# Altium footprint library MyPcbLib.PcbLib: 657 footprints (part 39 of 42)
Each footprint in its own frame and in the unit in brackets; x right, y up, seen from the top. Pads: shape width x height; smd on the part's side, far side on the other; paste and mask are expansions set on the pad; w line width, h text height; cw(c..) or ccw(c..) is an arc to the next point about the centre after c.
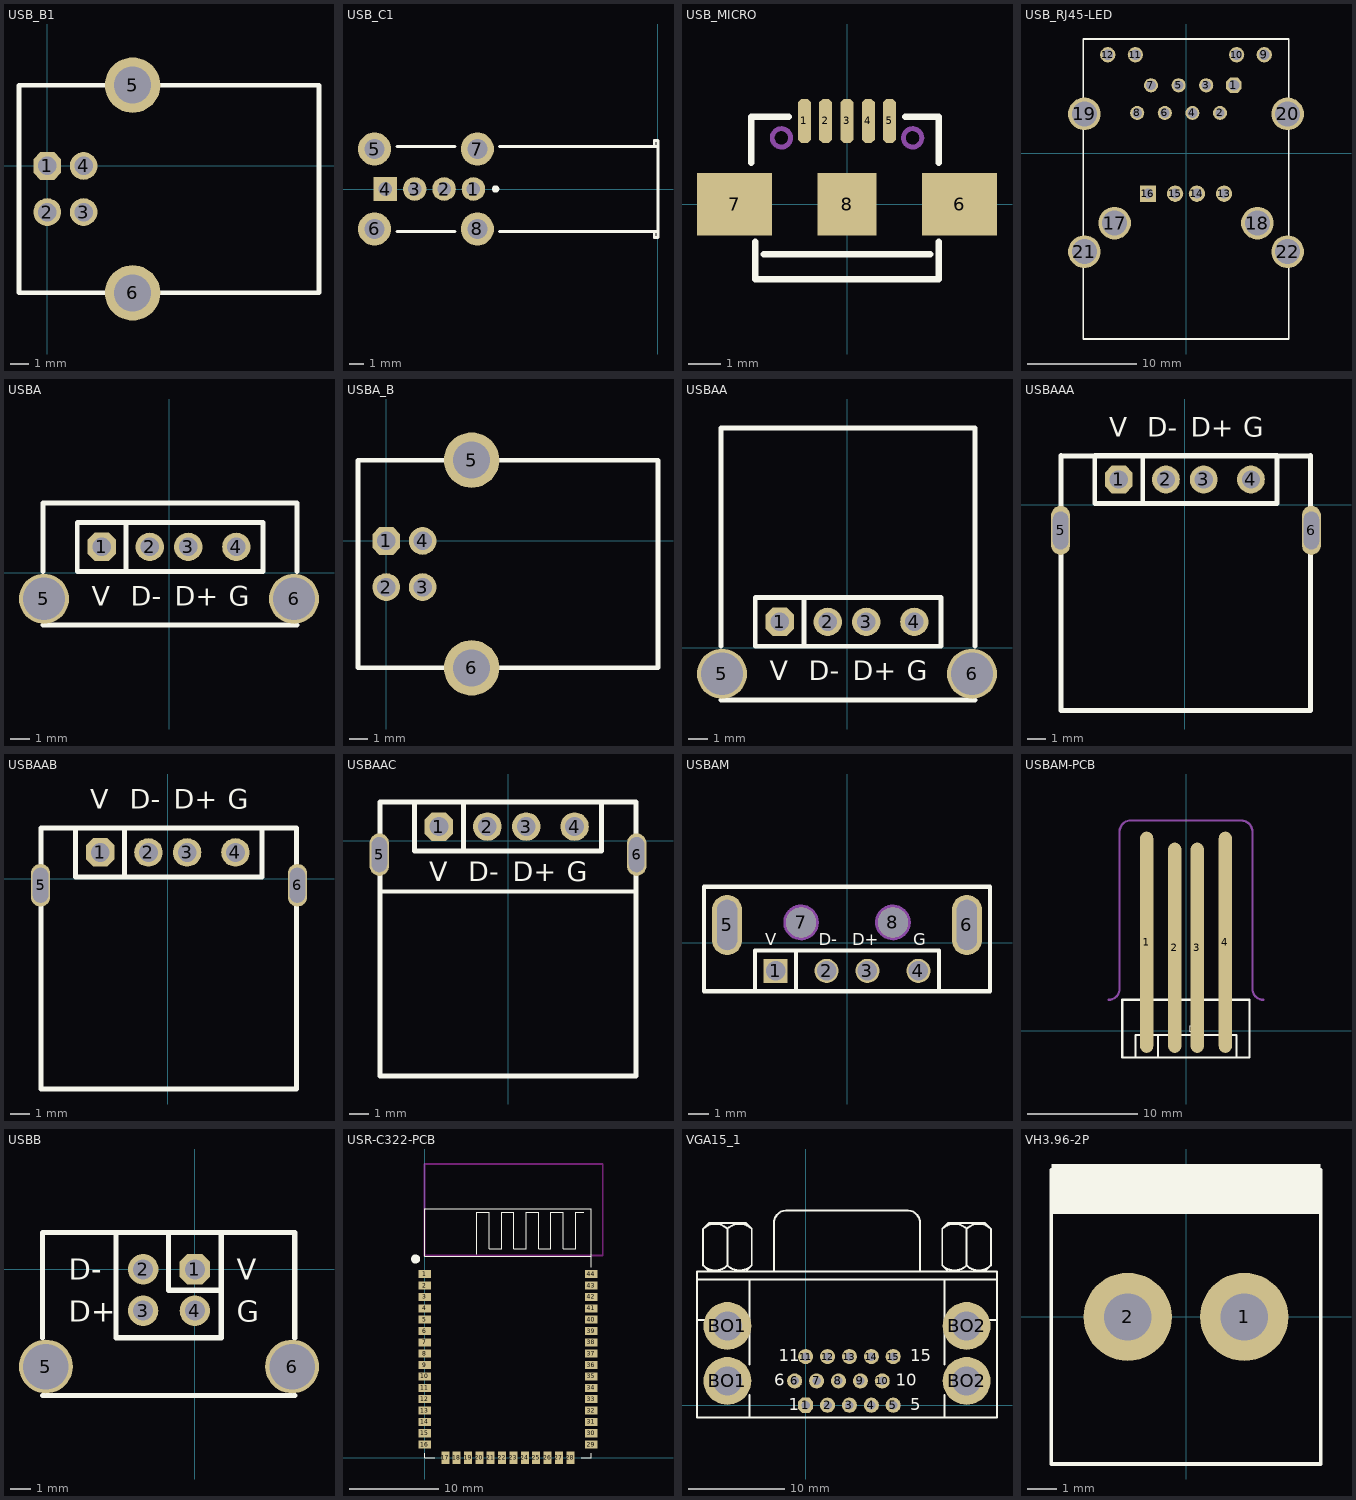
[diagram p38: the footprints below, top view; thin cyan lines are the x and y axes]

## USB_B1 [mil] "USB方孔"
height 314.96
pads (6):
  oct 60x60 hole 40: 1(0,0)
  round 60 hole 40: 2(0,-100) 3(78.74,-100) 4(78.74,0)
  round 120 hole 80: 5(185.04,175) 6(185.04,-275)
Top Overlay:
  lines w10: -61.26,-275 588.74,-275 588.74,175 -61.26,175 -61.26,-275

## USB_C1 [mm] "侧卧USB"
height 13.83
pads (8):
  round 1.6 hole 0.92: 1(-12.56,0) 2(-14.56,0) 3(-16.56,0)
  rect 1.6x1.6 hole 0.92: 4(-18.56,0)
  round 2.25 hole 1.35: 5(-19.29,2.72) 6(-19.29,-2.72) 7(-12.29,2.72) 8(-12.29,-2.72)
Top Overlay:
  circle w0.25: c-11.047,0 r0.125
  lines w0.2: -17.773,-2.88 -13.807,-2.88 ; -17.773,2.88 -13.807,2.88 ; -10.773,-2.88 0,-2.88 ; -10.773,2.88 0,2.88 ; -0.254,-2.88 -0.254,-3.302 0,-3.302 0,-2.88 ; -0.254,2.88 -0.254,3.302 0,3.302 0,2.88 ; 0,-2.88 0,2.88

## USB_MICRO [mm] "USB方孔"
height 8
pads (8):
  oct 0.4x1.35 smd: 1(-1.3,2.54) 2(-0.65,2.54) 3(0,2.54) 4(0.65,2.54) 5(1.3,2.54)
  rect 2.286x1.9 smd: 6(3.429,0) 7(-3.429,0)
  rect 1.8x1.9 smd: 8(0,0)
Top Overlay:
  lines w0.2: -2.921,1.27 -2.921,2.667 -1.778,2.667 ; -2.794,-1.143 -2.794,-2.286 2.794,-2.286 2.794,-1.143 ; -2.54,-1.524 2.54,-1.524 ; 1.778,2.667 2.794,2.667 2.794,1.27
Mechanical 1:
  circle w0.15: c-2,2.023 r0.28
  circle w0.15: c2,2.023 r0.28

## USB_RJ45-LED [mm]
pads (22):
  oct 1.4x1.4 hole 1: 1(4.4,6.25)
  round 1.3 hole 0.8: 2(3.13,3.71)
  round 1.3 hole 0.9: 3(1.86,6.25) 4(0.59,3.71) 5(-0.68,6.25) 6(-1.95,3.71) 7(-3.22,6.25) 8(-4.49,3.71)
  round 1.4 hole 1: 9(7.2,9.06) 10(4.66,9.06) 11(-4.66,9.06) 12(-7.2,9.06)
  round 1.5 hole 0.92: 13(3.5,-3.72) 14(1,-3.72) 15(-1,-3.72)
  rect 1.5x1.5 hole 0.92: 16(-3.5,-3.72)
  round 3 hole 2.3: 17(-6.57,-6.43) 18(6.57,-6.43) 19(-9.35,3.62) 20(9.35,3.62) 21(-9.35,-9.06) 22(9.35,-9.06)
Top Overlay:
  lines w0.152: -9.45,-17.09 -9.45,10.51 9.45,10.51 9.45,-17.09 -9.45,-17.09

## USBA [mm]
pads (6):
  oct 1.473x1.473 hole 0.965: 1(-3.5,1.35)
  round 1.473 hole 0.965: 2(-1,1.35) 3(1,1.35) 4(3.5,1.35)
  round 2.6 hole 2.2: 5(-6.5,-1.35) 6(6.5,-1.35)
Top Overlay:
  lines w0.254: -6.548,-2.714 6.66,-2.714 ; -6.548,0.08 -6.548,3.636 6.66,3.636 6.66,0.08 ; -2.23,0.08 -2.23,2.62 ; -4.77,0.08 -4.77,2.62 4.882,2.62 4.882,0.08 -4.77,0.08
  text "G" at 3.104,-1.698 h1.02
  text "V" at -4.008,-1.698 h1.02
  text "D+" at 0.31,-1.698 h1.02
  text "D-" at -1.976,-1.698 h1.02

## USBA_B [mil]
pads (6):
  oct 60x60 hole 40: 1(-0.24,-0.02)
  round 60 hole 40: 2(-0.24,-100.02) 3(78.5,-100.02) 4(78.5,-0.02)
  round 120 hole 80: 5(184.79,174.98) 6(184.79,-275.02)
Top Overlay:
  lines w10: -61.5,-275.02 588.5,-275.02 588.5,174.98 -61.5,174.98 -61.5,-275.02

## USBAA [mm]
pads (6):
  oct 1.473x1.473 hole 0.965: 1(-3.5,1.35)
  round 1.473 hole 0.965: 2(-1,1.35) 3(1,1.35) 4(3.5,1.35)
  round 2.6 hole 2.2: 5(-6.5,-1.35) 6(6.5,-1.35)
Top Overlay:
  lines w0.254: -6.548,-2.714 6.66,-2.714 ; -6.548,0.08 -6.548,11.434 6.66,11.434 6.66,0.08 ; -2.23,0.08 -2.23,2.62 ; -4.77,0.08 -4.77,2.62 4.882,2.62 4.882,0.08 -4.77,0.08
  text "G" at 3.104,-1.698 h1.02
  text "V" at -4.008,-1.698 h1.02
  text "D+" at 0.31,-1.698 h1.02
  text "D-" at -1.976,-1.698 h1.02

## USBAAA [mil]
pads (6):
  oct 58x58 hole 38: 1(-137.8,53.15)
  round 58 hole 38: 2(-39.37,53.15) 3(39.37,53.15) 4(137.8,53.15)
  oval 39.37x102.36 hole 31.5 slot 78.74 at 90 deg: 5(-259,-53) 6(264,-53)
Top Overlay:
  lines w10: -257.8,103 -257.8,-428.5 262.2,-428.5 262.2,103 ; -255,102 262,102 ; -87.8,3.15 -87.8,103.15 ; -187.8,3.15 192.2,3.15 192.2,103.15 -187.8,103.15 -187.8,3.15
  text "D-" at -77.8,142.37 h40
  text "D+" at 12.2,142.37 h40
  text "V" at -157.8,142.37 h40
  text "G" at 122.2,142.37 h40

## USBAAB [mm]
pads (6):
  oct 1.473x1.473 hole 0.965: 1(-3.5,1.35)
  round 1.473 hole 0.965: 2(-1,1.35) 3(1,1.35) 4(3.5,1.35)
  oval 1x2.2 hole 0.8 slot 1.8 at 90 deg: 5(-6.579,-0.346) 6(6.706,-0.346)
Top Overlay:
  lines w0.254: -2.23,0.08 -2.23,2.62 ; -6.548,-10.884 6.66,-10.884 6.66,2.616 -6.548,2.616 -6.548,-10.884 ; -4.77,0.08 4.882,0.08 4.882,2.62 -4.77,2.62 -4.77,0.08
  text "D-" at -1.976,3.616 h1.02
  text "D+" at 0.31,3.616 h1.02
  text "V" at -4.008,3.616 h1.02
  text "G" at 3.104,3.616 h1.02

## USBAAC [mil] "沉板"
pads (6):
  oct 58x58 hole 38: 1(-140.3,28.54)
  round 58 hole 38: 2(-41.87,28.54) 3(36.87,28.54) 4(135.3,28.54)
  oval 39.37x86.61 hole 31.5 slot 70.87 at 90 deg: 5(-261.5,-28.54) 6(261.5,-28.54)
Top Overlay:
  lines w8: -260.3,-103.46 258.7,-103.46
  lines w10: -90.3,-21.46 -90.3,78.54 ; -260.3,-478.46 -260.3,78.39 259.7,78.39 259.7,-478.46 -260.3,-478.46 ; -190.3,-21.46 -190.3,78.54 189.7,78.54 189.7,-21.46 -190.3,-21.46
  text "G" at 119.7,-82.24 h40
  text "V" at -160.3,-82.24 h40
  text "D+" at 9.7,-82.24 h40
  text "D-" at -80.3,-82.24 h40

## USBAM [mm]
pads (8):
  rect 1.2x1.2 hole 0.965: 1(-3.556,-1.397)
  round 1.2 hole 0.965: 2(-1.016,-1.397) 3(1.016,-1.397) 4(3.556,-1.397)
  oval 1.5x3 hole 1 slot 2.5 at 90 deg: 5(-5.969,0.889) 6(5.969,0.889)
  round 1.5 hole 1.5: 7(-2.286,1.016) 8(2.286,1.016)
Top Overlay:
  lines w0.203: -4.572,-2.413 -4.572,-0.381 4.572,-0.381 4.572,-2.413 ; -2.54,-2.413 -2.54,-0.381 ; -7.112,-2.413 7.112,-2.413 7.112,2.794 -7.112,2.794 -7.112,-2.413
  text "G" at 3.302,-0.127 h0.6
  text "V" at -4.064,-0.127 h0.6
  text "D+" at 0.254,-0.127 h0.6
  text "D-" at -1.397,-0.127 h0.6
Mechanical 1:
  circle w0.254: c-2.286,1.016 r0.762
  circle w0.254: c2.286,1.016 r0.762

## USBAM-PCB [mm]
pads (4):
  oval 1.2x20 smd: 1(-3.556,8) 4(3.556,8)
  oval 1.2x19 smd: 2(-1.016,7.5) 3(1.016,7.5)
Top Overlay:
  lines w0.203: -4.572,-2.413 -4.572,-0.381 4.572,-0.381 4.572,-2.413 ; -2.54,-2.413 -2.54,-0.381 ; -5.766,-2.413 -5.766,2.794 5.74,2.794 5.74,-2.413 -5.766,-2.413
  text "D-" at -1.397,-0.127 h0.6
  text "D+" at 0.254,-0.127 h0.6
  text "V" at -4.064,-0.127 h0.6
  text "G" at 3.302,-0.127 h0.6
Mechanical 1:
  lines w0.203: -7,2.8 ccw(c-7,3.8) -6,3.8 ; -6,3.8 -6,18 ; -6,18.026 cw(c-5,18) -4.974,19 ; -5,19 5,19 cw(c5,18) 6,18 6,3.8 ccw(c7,3.8) 7,2.8

## USBB [mm]
pads (6):
  oct 1.473x1.473 hole 0.965: 1(0,0)
  round 1.473 hole 0.965: 2(-2.5,0) 3(-2.5,-2) 4(0,-2)
  round 2.6 hole 2.2: 5(-7.2,-4.7) 6(4.7,-4.7)
Top Overlay:
  lines w0.254: -7.366,-6.096 4.826,-6.096 ; -7.366,-3.302 -7.366,1.778 4.826,1.778 4.826,-3.302 ; -3.81,1.778 -3.81,-3.302 1.27,-3.302 1.27,1.778 ; -1.27,1.778 -1.27,-1.016 1.27,-1.016
  text "G" at 2.032,-2.54 h1.02
  text "V" at 2.032,-0.508 h1.02
  text "D+" at -6.096,-2.54 h1.02
  text "D-" at -6.096,-0.508 h1.02

## USR-C322-PCB [mm]
pads (44):
  rect 1.4x0.9 smd: 1(0,20.52) 2(0,19.25) 3(0,17.98) 4(0,16.71) 5(0,15.44) 6(0,14.17) 7(0,12.9) 8(0,11.63) 9(0,10.36) 10(0,9.09) 11(0,7.82) 12(0,6.55) 13(0,5.28) 14(0,4.01) 15(0,2.74) 16(0,1.47) 29(18.62,1.47) 30(18.62,2.74) 31(18.62,4.01) 32(18.62,5.28) 33(18.62,6.55) 34(18.62,7.82) 35(18.62,9.09) 36(18.62,10.36) 37(18.62,11.63) 38(18.62,12.9) 39(18.62,14.17) 40(18.62,15.44) 41(18.62,16.71) 42(18.62,17.98) 43(18.62,19.25) 44(18.62,20.52)
  rect 0.9x1.4 smd: 17(2.31,0) 18(3.58,0) 19(4.85,0) 20(6.12,0) 21(7.39,0) 22(8.66,0) 23(9.93,0) 24(11.2,0) 25(12.47,0) 26(13.74,0) 27(15.02,0) 28(16.29,0)
Top Overlay:
  circle w0.508: c-1.016,22.225 r0.254
  lines w0.07: 0,0.5 0,0 1.12,0 ; 5.836,22.76 5.836,23.36 5.836,27.43 ; 5.836,27.42 7.206,27.42 ; 7.216,23.37 7.216,27.43 7.216,23.36 8.596,23.36 8.596,27.43 ; 8.596,23.37 8.596,27.43 ; 9.976,23.37 9.976,27.43 ; 11.346,23.36 9.976,23.36 9.976,27.43 ; 11.356,23.35 11.356,27.42 ; 11.356,23.37 11.356,27.43 12.726,27.43 ; 12.736,23.37 14.116,23.37 14.116,27.43 14.116,23.36 ; 12.736,27.42 12.736,23.36 12.736,27.43 ; 14.116,27.42 15.496,27.42 ; 15.496,23.36 15.496,27.43 ; 16.876,27.42 17.796,27.42 ; 16.876,27.43 16.876,23.37 15.496,23.37 ; 17.5,0 18.62,0 18.62,0.5 ; 18.62,21.31 18.62,23.07 ; 18.62,21.5 18.62,27.813 0,27.813 0,22.55 18.62,22.55 ; 8.596,27.43 9.976,27.43 ; 15.496,23.37 15.496,27.43 ; 15.496,23.37 15.496,27.43
Keep-Out Layer:
  lines w0.203: -0.036,22.606 19.914,22.606 19.914,32.842 -0.01,32.842 -0.01,22.555

## VGA15_1 [mil]
pads (19):
  oct 62x62 hole 35: 1(0,0)
  round 62 hole 35: 2(90,0) 3(180,0) 4(270,0) 5(360,0) 6(-45,100) 7(45,100) 8(135,100) 9(225,100) 10(315,100) 11(0,200) 12(90,200) 13(180,200) 14(270,200) 15(360,200)
  round 196.67 hole 118.33: BO1(-321.67,100) BO1(-321.67,325.83) BO2(661.67,100) BO2(661.67,325.83)
Top Overlay:
  lines w8: -446.67,350 -230,350 ; -446.67,516.67 786.67,516.67 ; -421.75,574.91 ccw(c-371.67,625) -321.58,574.91 ; -421.75,725.09 cw(c-371.67,675) -321.58,725.09 ; -396.67,550 -421.67,575 -421.67,725 -396.67,750 -246.67,750 -221.67,725 -221.67,575 -246.67,550 ; -321.75,574.91 ccw(c-271.67,625) -221.58,574.91 ; -321.75,725.09 cw(c-271.67,675) -221.58,725.09 ; -321.67,575 -321.67,725 ; -230,-50 -230,41.67 ; -230,166.67 -230,350 ; -230,516.67 -230,350 ; -130,550 -130,750 cw(c-80,750) -80,800 420,800 cw(c420,750) 470,750 470,550 ; 561.58,574.91 ccw(c611.67,625) 661.75,574.91 ; 561.58,725.09 cw(c611.67,675) 661.75,725.09 ; 570,-50 570,41.67 ; 570,166.67 570,350 ; 570,516.67 570,350 ; 586.67,550 561.67,575 561.67,725 586.67,750 736.67,750 761.67,725 761.67,575 736.67,550 ; 661.58,574.91 ccw(c711.67,625) 761.75,574.91 ; 661.58,725.09 cw(c711.67,675) 761.75,725.09 ; 661.67,575 661.67,725 ; 786.67,350 570,350 ; -446.67,-50 -446.67,550 786.67,550 786.67,-50 -446.67,-50
  text "5" at 430,-20 h50
  text "10" at 370,80 h50
  text "15" at 430,180 h50
  text "11" at -110,180 h50
  text "6" at -130,80 h50
  text "1" at -70,-20 h50

## VH3.96-2P [mm]
pads (2):
  round 3 hole 1.6: 1(1.98,0) 2(-1.98,0)
Top Overlay:
  rectangle: -4.58,3.5 4.58,5.2
  lines w0.127: -4.58,5 -4.58,-5 4.58,-5 4.58,5